# Altium integrated library GPDSE.IntLib: 634 symbols (part 6 of 7)
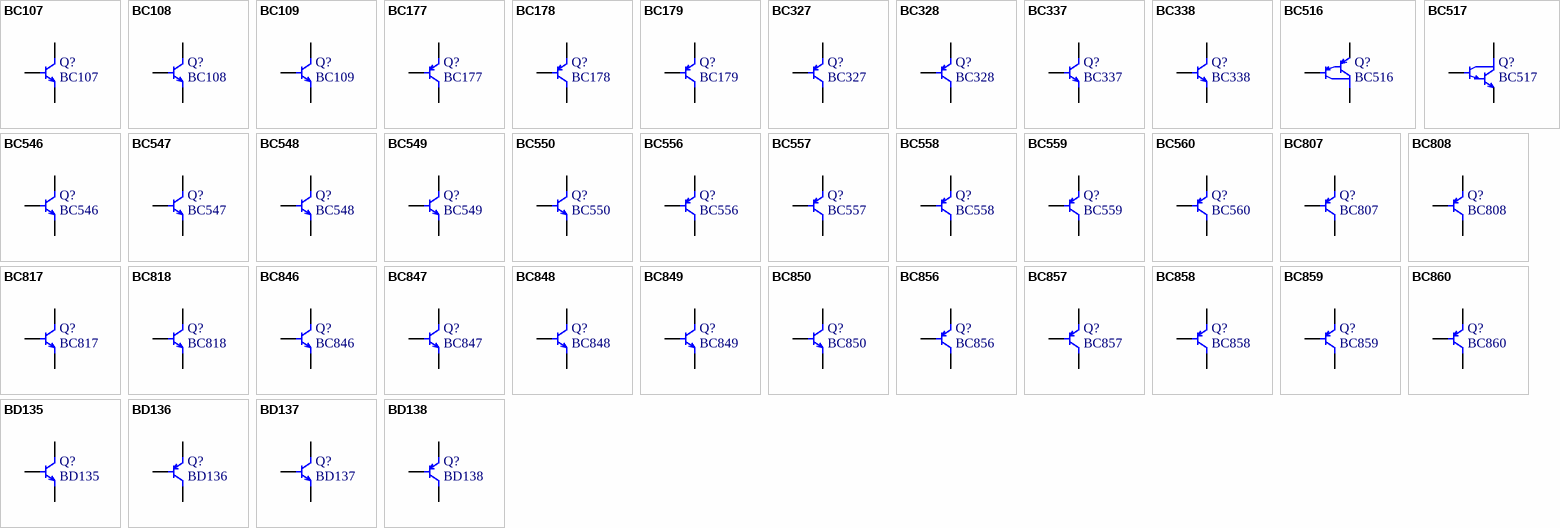
[diagram p40: symbols BC107 to BD138]

## BC338
designator Q?
NPN Epitaxial Silicon Transistor; Complementary Part: BC328; Collector-Emitter Voltage (Vce): 30 V; Emitter-Base Voltage (Veb): 5 V; Collector Current (Ic): 800 mA; Total Power Dissipation (Ptot): 625 mW; DC Current Gain Min (hfe): 60; DC Current Gain Max (hfe): 630; Transition Frequency (fT): 100 MHz
footprint TO-92/CBE (Transistor Outline Package, Case Style 92 CBE; 3D Sergey Atanov)
pins: B, C, E

## BC516
designator Q?
PNP Darlington Transistor; Complementary Part: BC517; Collector-Emitter Voltage (Vce): -30 V; Collector-Base Voltage (Vcb): -40 V; Emitter-Base Voltage (Veb): -10 V; DC Current Gain Min (hfe): 30.000; Power Dissipation (Pd): 625 mW; Transition Frequency (fT): 200 MHz; Collector Current (Ic): -1 A
footprint TO-92/CBE (Transistor Outline Package, Case Style 92 CBE; 3D Sergey Atanov)
pins: B, C, E

## BC517
designator Q?
NPN Darlington Transistor; Complementary Part: BC516; Collector-Emitter Voltage (Vce): 30 V; Collector-Base Voltage (Vcb): 40 V; Emitter-Base Voltage (Veb): 10 V; DC Current Gain Min (hfe): 30.000; Power Dissipation (Pd): 625 mW; Collector Current (Ic): 1.2 A
footprint TO-92/CBE (Transistor Outline Package, Case Style 92 CBE; 3D Sergey Atanov)
pins: B, C, E

## BC546
designator Q?
NPN Epitaxial Silicon Transistor; Complementary Part: BC556; Collector-Base Voltage (Vcb): 80 V; Collector-Emitter Voltage (Vce): 65 V; Emitter-Base Voltage (Veb): 6 V; Collector Current (Ic): 100 mA; Total Power Dissipation (Ptot): 500 mW; DC Current Gain Min (hfe): 110; DC Current Gain Max (hfe): 800; Transition Frequency (fT): 300 MHz
footprint TO-92/CBE (Transistor Outline Package, Case Style 92 CBE; 3D Sergey Atanov)
pins: B, C, E

## BC547
designator Q?
NPN Epitaxial Silicon Transistor; Complementary Part: BC557; Collector-Base Voltage (Vcb): 50 V; Collector-Emitter Voltage (Vce): 45 V; Emitter-Base Voltage (Veb): 6 V; Collector Current (Ic): 100 mA; Total Power Dissipation (Ptot): 500 mW; DC Current Gain Min (hfe): 110; DC Current Gain Max (hfe): 800; Transition Frequency (fT): 300 MHz
footprint TO-92/CBE (Transistor Outline Package, Case Style 92 CBE; 3D Sergey Atanov)
pins: B, C, E

## BC548
designator Q?
NPN Epitaxial Silicon Transistor; Complementary Part: BC558; Collector-Base Voltage (Vcb): 30 V; Emitter-Base Voltage (Veb): 5 V; Collector Current (Ic): 100 mA; Total Power Dissipation (Ptot): 500 mW; DC Current Gain Min (hfe): 110; DC Current Gain Max (hfe): 800; Transition Frequency (fT): 300 MHz; Collector-Emitter Voltage (Vce): 30 V
footprint TO-92/CBE (Transistor Outline Package, Case Style 92 CBE; 3D Sergey Atanov)
pins: B, C, E

## BC549
designator Q?
NPN Epitaxial Silicon Transistor; Complementary Part: BC559; Collector-Base Voltage (Vcb): 30 V; Emitter-Base Voltage (Veb): 5 V; Collector Current (Ic): 100 mA; Total Power Dissipation (Ptot): 500 mW; DC Current Gain Min (hfe): 110; DC Current Gain Max (hfe): 800; Transition Frequency (fT): 300 MHz; Collector-Emitter Voltage (Vce): 30 V
footprint TO-92/CBE (Transistor Outline Package, Case Style 92 CBE; 3D Sergey Atanov)
pins: B, C, E

## BC550
designator Q?
NPN Epitaxial Silicon Transistor; Complementary Part: BC560; Collector-Base Voltage (Vcb): 50 V; Collector-Emitter Voltage (Vce): 45 V; Emitter-Base Voltage (Veb): 5 V; Collector Current (Ic): 100 mA; Total Power Dissipation (Ptot): 500 mW; DC Current Gain Min (hfe): 110; DC Current Gain Max (hfe): 800; Transition Frequency (fT): 300 MHz
footprint TO-92/CBE (Transistor Outline Package, Case Style 92 CBE; 3D Sergey Atanov)
pins: B, C, E

## BC556
designator Q?
PNP Epitaxial Silicon Transistor; Complementary Part: BC546; Collector-Base Voltage (Vcb): -80 V; Collector-Emitter Voltage (Vce): -65 V; Emitter-Base Voltage (Veb): -5 V; Collector Current (Ic): -100 mA; Total Power Dissipation (Ptot): 500 mW; DC Current Gain Min (hfe): 110; DC Current Gain Max (hfe): 800; Transition Frequency (fT): 150 MHz
footprint TO-92/CBE (Transistor Outline Package, Case Style 92 CBE; 3D Sergey Atanov)
pins: B, C, E

## BC557
designator Q?
PNP Epitaxial Silicon Transistor; Complementary Part: BC547; Collector-Base Voltage (Vcb): -50 V; Collector-Emitter Voltage (Vce): -45 V; Emitter-Base Voltage (Veb): -5 V; Collector Current (Ic): -100 mA; Total Power Dissipation (Ptot): 500 mW; DC Current Gain Min (hfe): 110; DC Current Gain Max (hfe): 800; Transition Frequency (fT): 150 MHz
footprint TO-92/CBE (Transistor Outline Package, Case Style 92 CBE; 3D Sergey Atanov)
pins: B, C, E

## BC558
designator Q?
PNP Epitaxial Silicon Transistor; Complementary Part: BC548; Collector-Base Voltage (Vcb): -30 V; Emitter-Base Voltage (Veb): -5 V; Collector Current (Ic): -100 mA; Total Power Dissipation (Ptot): 500 mW; DC Current Gain Min (hfe): 110; DC Current Gain Max (hfe): 800; Transition Frequency (fT): 150 MHz; Collector-Emitter Voltage (Vce): -30 V
footprint TO-92/CBE (Transistor Outline Package, Case Style 92 CBE; 3D Sergey Atanov)
pins: B, C, E

## BC559
designator Q?
PNP Epitaxial Silicon Transistor; Complementary Part: BC549; Collector-Base Voltage (Vcb): -30 V; Emitter-Base Voltage (Veb): -5 V; Collector Current (Ic): -100 mA; Total Power Dissipation (Ptot): 500 mW; DC Current Gain Min (hfe): 110; DC Current Gain Max (hfe): 800; Transition Frequency (fT): 150 MHz; Collector-Emitter Voltage (Vce): -30 V
footprint TO-92/CBE (Transistor Outline Package, Case Style 92 CBE; 3D Sergey Atanov)
pins: B, C, E

## BC560
designator Q?
PNP Epitaxial Silicon Transistor; Complementary Part: BC550; Collector-Base Voltage (Vcb): -50 V; Collector-Emitter Voltage (Vce): -45 V; Emitter-Base Voltage (Veb): -5 V; Collector Current (Ic): -100 mA; Total Power Dissipation (Ptot): 500 mW; DC Current Gain Min (hfe): 110; DC Current Gain Max (hfe): 800; Transition Frequency (fT): 150 MHz
footprint TO-92/CBE (Transistor Outline Package, Case Style 92 CBE; 3D Sergey Atanov)
pins: B, C, E

## BC807
designator Q?
PNP Epitaxial Silicon Transistor; Complementary Part: BC817; Collector-Base Voltage (Vcb): -50 V; Collector-Emitter Voltage (Vce): -45 V; Emitter-Base Voltage (Veb): -5 V; Collector Current (Ic): -800 mA; Total Power Dissipation (Ptot): 310 mW; DC Current Gain Min (hfe): 60; DC Current Gain Max (hfe): 630; Transition Frequency (fT): 100 MHz
footprint SOT-23/3 (Small Outline Transistor 3 leads); pin to pad B>1 C>3 E>2
pins: B, C, E

## BC808
designator Q?
PNP Epitaxial Silicon Transistor; Complementary Part: BC818; Collector-Base Voltage (Vcb): -30 V; Collector-Emitter Voltage (Vce): -25 V; Emitter-Base Voltage (Veb): -5 V; Collector Current (Ic): -800 mA; Total Power Dissipation (Ptot): 310 mW; DC Current Gain Min (hfe): 60; DC Current Gain Max (hfe): 630; Transition Frequency (fT): 100 MHz
footprint SOT-23/3 (Small Outline Transistor 3 leads); pin to pad B>1 C>3 E>2
pins: B, C, E

## BC817
designator Q?
NPN Epitaxial Silicon Transistor; Complementary Part: BC807; Collector-Base Voltage (Vcb): 50 V; Collector-Emitter Voltage (Vce): 45 V; Emitter-Base Voltage (Veb): 5 V; Collector Current (Ic): 800 mA; Total Power Dissipation (Ptot): 310 mW; DC Current Gain Min (hfe): 60; DC Current Gain Max (hfe): 630; Transition Frequency (fT): 100 MHz
footprint SOT-23/3 (Small Outline Transistor 3 leads); pin to pad B>1 C>3 E>2
pins: B, C, E

## BC818
designator Q?
NPN Epitaxial Silicon Transistor; Complementary Part: BC808; Collector-Base Voltage (Vcb): 30 V; Collector-Emitter Voltage (Vce): 25 V; Emitter-Base Voltage (Veb): 5 V; Collector Current (Ic): 800 mA; Total Power Dissipation (Ptot): 310 mW; DC Current Gain Min (hfe): 60; DC Current Gain Max (hfe): 630; Transition Frequency (fT): 100 MHz
footprint SOT-23/3 (Small Outline Transistor 3 leads); pin to pad B>1 C>3 E>2
pins: B, C, E

## BC846
designator Q?
NPN Epitaxial Silicon Transistor; Complementary Part: BC856; Collector-Base Voltage (Vcb): 80 V; Collector-Emitter Voltage (Vce): 65 V; Emitter-Base Voltage (Veb): 6 V; Collector Current (Ic): 100 mA; Total Power Dissipation (Ptot): 310 mW; DC Current Gain Min (hfe): 110; DC Current Gain Max (hfe): 800; Transition Frequency (fT): 300 MHz
footprint SOT-23/3 (Small Outline Transistor 3 leads); pin to pad B>1 C>3 E>2
pins: B, C, E

## BC847
designator Q?
NPN Epitaxial Silicon Transistor; Complementary Part: BC857; Collector-Base Voltage (Vcb): 50 V; Collector-Emitter Voltage (Vce): 45 V; Emitter-Base Voltage (Veb): 6 V; Collector Current (Ic): 100 mA; Total Power Dissipation (Ptot): 310 mW; DC Current Gain Min (hfe): 110; DC Current Gain Max (hfe): 800; Transition Frequency (fT): 300 MHz
footprint SOT-23/3 (Small Outline Transistor 3 leads); pin to pad B>1 C>3 E>2
pins: B, C, E

## BC848
designator Q?
NPN Epitaxial Silicon Transistor; Complementary Part: BC858; Collector-Base Voltage (Vcb): 30 V; Emitter-Base Voltage (Veb): 5 V; Collector Current (Ic): 100 mA; Total Power Dissipation (Ptot): 310 mW; DC Current Gain Min (hfe): 110; DC Current Gain Max (hfe): 800; Transition Frequency (fT): 300 MHz; Collector-Emitter Voltage (Vce): 30 V
footprint SOT-23/3 (Small Outline Transistor 3 leads); pin to pad B>1 C>3 E>2
pins: B, C, E

## BC849
designator Q?
NPN Epitaxial Silicon Transistor; Complementary Part: BC859; Collector-Base Voltage (Vcb): 30 V; Emitter-Base Voltage (Veb): 5 V; Collector Current (Ic): 100 mA; Total Power Dissipation (Ptot): 310 mW; DC Current Gain Min (hfe): 110; DC Current Gain Max (hfe): 800; Transition Frequency (fT): 300 MHz; Collector-Emitter Voltage (Vce): 30 V
footprint SOT-23/3 (Small Outline Transistor 3 leads); pin to pad B>1 C>3 E>2
pins: B, C, E

## BC850
designator Q?
NPN Epitaxial Silicon Transistor; Complementary Part: BC860; Collector-Base Voltage (Vcb): 50 V; Collector-Emitter Voltage (Vce): 45 V; Emitter-Base Voltage (Veb): 5 V; Collector Current (Ic): 100 mA; Total Power Dissipation (Ptot): 310 mW; DC Current Gain Min (hfe): 110; DC Current Gain Max (hfe): 800; Transition Frequency (fT): 300 MHz
footprint SOT-23/3 (Small Outline Transistor 3 leads); pin to pad B>1 C>3 E>2
pins: B, C, E

## BC856
designator Q?
PNP Epitaxial Silicon Transistor; Complementary Part: BC846; Collector-Base Voltage (Vcb): -80 V; Collector-Emitter Voltage (Vce): -65 V; Emitter-Base Voltage (Veb): -5 V; Collector Current (Ic): -100 mA; Total Power Dissipation (Ptot): 310 mW; DC Current Gain Min (hfe): 110; DC Current Gain Max (hfe): 800; Transition Frequency (fT): 150 MHz
footprint SOT-23/3 (Small Outline Transistor 3 leads); pin to pad B>1 C>3 E>2
pins: B, C, E

## BC857
designator Q?
PNP Epitaxial Silicon Transistor; Complementary Part: BC847; Collector-Base Voltage (Vcb): -50 V; Collector-Emitter Voltage (Vce): -45 V; Emitter-Base Voltage (Veb): -5 V; Collector Current (Ic): -100 mA; Total Power Dissipation (Ptot): 310 mW; DC Current Gain Min (hfe): 110; DC Current Gain Max (hfe): 800; Transition Frequency (fT): 150 MHz
footprint SOT-23/3 (Small Outline Transistor 3 leads); pin to pad B>1 C>3 E>2
pins: B, C, E

## BC858
designator Q?
PNP Epitaxial Silicon Transistor; Complementary Part: BC848; Collector-Base Voltage (Vcb): -30 V; Emitter-Base Voltage (Veb): -5 V; Collector Current (Ic): -100 mA; Total Power Dissipation (Ptot): 310 mW; DC Current Gain Min (hfe): 110; DC Current Gain Max (hfe): 800; Transition Frequency (fT): 150 MHz; Collector-Emitter Voltage (Vce): -30 V
footprint SOT-23/3 (Small Outline Transistor 3 leads); pin to pad B>1 C>3 E>2
pins: B, C, E

## BC859
designator Q?
PNP Epitaxial Silicon Transistor; Complementary Part: BC849; Collector-Base Voltage (Vcb): -30 V; Emitter-Base Voltage (Veb): -5 V; Collector Current (Ic): -100 mA; Total Power Dissipation (Ptot): 310 mW; DC Current Gain Min (hfe): 110; DC Current Gain Max (hfe): 800; Transition Frequency (fT): 150 MHz; Collector-Emitter Voltage (Vce): -30 V
footprint SOT-23/3 (Small Outline Transistor 3 leads); pin to pad B>1 C>3 E>2
pins: B, C, E

## BC860
designator Q?
PNP Epitaxial Silicon Transistor; Complementary Part: BC850; Collector-Base Voltage (Vcb): -50 V; Collector-Emitter Voltage (Vce): -45 V; Emitter-Base Voltage (Veb): -5 V; Collector Current (Ic): -100 mA; Total Power Dissipation (Ptot): 310 mW; DC Current Gain Min (hfe): 110; DC Current Gain Max (hfe): 800; Transition Frequency (fT): 150 MHz
footprint SOT-23/3 (Small Outline Transistor 3 leads); pin to pad B>1 C>3 E>2
pins: B, C, E

## BD135
designator Q?
NPN Epitaxial Silicon Transistor; Complementary Part: BD136; Collector-Base Voltage (Vcb): 45 V; Emitter-Base Voltage (Veb): 5 V; Collector Current (Ic): 1.5 A; Collector Peak Current (Icp): 3 A; Base Peak Current (Ibp): 0.5 A; Total Power Dissipation (Ptot): 12.5 W; DC Current Gain Min (hfe): 25; DC Current Gain Max (hfe): 250; Collector-Emitter Voltage (Vce): 45 V
footprint TO-126/ECB
pins: B, C, E

## BD136
designator Q?
PNP Epitaxial Silicon Transistor; Collector-Base Voltage (Vcb): -45 V; Emitter-Base Voltage (Veb): -5 V; Collector Current (Ic): -1.5 A; Collector Peak Current (Icp): -3 A; Base Peak Current (Ibp): -0.5 A; Total Power Dissipation (Ptot): 12.5 W; DC Current Gain Min (hfe): 25; DC Current Gain Max (hfe): 250; Collector-Emitter Voltage (Vce): -45 V; Complementary Part: BD136
footprint TO-126/ECB
pins: B, C, E

## BD137
designator Q?
NPN Epitaxial Silicon Transistor; Complementary Part: BD138; Collector-Base Voltage (Vcb): 60 V; Emitter-Base Voltage (Veb): 5 V; Collector Current (Ic): 1.5 A; Collector Peak Current (Icp): 3 A; Base Peak Current (Ibp): 0.5 A; Total Power Dissipation (Ptot): 12.5 W; DC Current Gain Min (hfe): 25; DC Current Gain Max (hfe): 250; Collector-Emitter Voltage (Vce): 60 V
footprint TO-126/ECB
pins: B, C, E

## BD138
designator Q?
PNP Epitaxial Silicon Transistor; Collector-Base Voltage (Vcb): -60 V; Emitter-Base Voltage (Veb): -5 V; Collector Current (Ic): -1.5 A; Collector Peak Current (Icp): -3 A; Base Peak Current (Ibp): -0.5 A; Total Power Dissipation (Ptot): 12.5 W; DC Current Gain Min (hfe): 25; DC Current Gain Max (hfe): 250; Collector-Emitter Voltage (Vce): -60 V; Complementary Part: BD138
footprint TO-126/ECB
pins: B, C, E

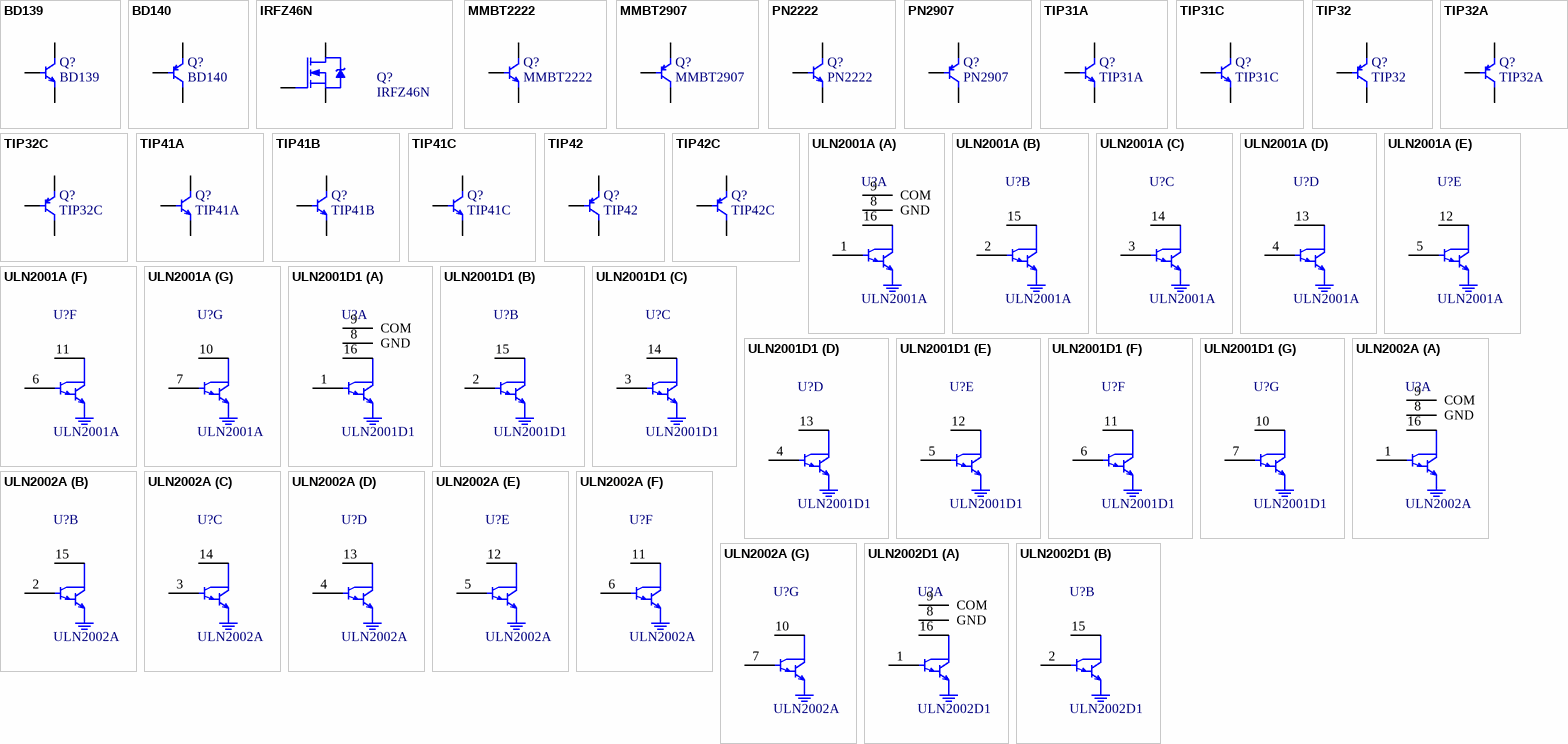
[diagram p25: symbols BD139 to ULN2002D1]

## BD139
designator Q?
NPN Epitaxial Silicon Transistor; Complementary Part: BD140; Collector-Base Voltage (Vcb): 80 V; Emitter-Base Voltage (Veb): 5 V; Collector Current (Ic): 1.5 A; Collector Peak Current (Icp): 3 A; Base Peak Current (Ibp): 0.5 A; Total Power Dissipation (Ptot): 12.5 W; DC Current Gain Min (hfe): 25; DC Current Gain Max (hfe): 250; Collector-Emitter Voltage (Vce): 80 V
footprint TO-126/ECB
pins: B, C, E

## BD140
designator Q?
PNP Epitaxial Silicon Transistor; Collector-Base Voltage (Vcb): -80 V; Emitter-Base Voltage (Veb): -5 V; Collector Current (Ic): -1.5 A; Collector Peak Current (Icp): -3 A; Base Peak Current (Ibp): -0.5 A; Total Power Dissipation (Ptot): 12.5 W; DC Current Gain Min (hfe): 25; DC Current Gain Max (hfe): 250; Collector-Emitter Voltage (Vce): -80 V; Complementary Part: BD140
footprint TO-126/ECB
pins: B, C, E

## IRFZ46N
designator Q?
HEXFET Power MOSFET; Drain Current (Id): 53 A; Drain Current Peak (Idp): 180 A; Power Dissipation (Pd): 107 W; Gate-to-Source Voltage (Vgs): 20 V; Static Drain-to-Source On-Resistance (Rdson): 16.5 mR; Turn-On Delay (tdon): 14 ns; Rise Time (Rt): 76 ns; Fall Time (Tf): 57 ns; Turn-Off Delay (Tdoff): 52 ns
footprint TO-220/123 (TO, Thru-Hole, Vertical, Heatsink Mounted; 3 In-Line Leads; Pitch 2.54 mm); pin to pad D>2 G>1 S>3
pins: D, G, S

## MMBT2222
designator Q?
NPN Epitaxial Silicon Transistor; Complementary Part: MMBT2907; Collector-Base Voltage (Vcb): 60 V; Collector-Emitter Voltage (Vce): 30 V; Emitter-Base Voltage (Veb): 5 V; Collector Current (Ic): 600 mA; Total Power Dissipation (Ptot): 350 mW; DC Current Gain Min (hfe): 35; DC Current Gain Max (hfe): 300; Transition Frequency (fT): 300 MHz
footprint SOT-23/3 (Small Outline Transistor 3 leads); pin to pad B>1 C>3 E>2
pins: B, C, E

## MMBT2907
designator Q?
PNP Epitaxial Silicon Transistor; Complementary Part: MMBT2222; Collector-Base Voltage (Vcb): -60 V; Collector-Emitter Voltage (Vce): -40 V; Emitter-Base Voltage (Veb): -5 V; Collector Current (Ic): -800 mA; Total Power Dissipation (Ptot): 350 mW; DC Current Gain Min (hfe): 30; DC Current Gain Max (hfe): 300; Transition Frequency (fT): 300 MHz
footprint SOT-23/3 (Small Outline Transistor 3 leads); pin to pad B>1 C>3 E>2
pins: B, C, E

## PN2222
designator Q?
NPN Epitaxial Silicon Transistor; Complementary Part: PN2907; Collector-Base Voltage (Vcb): 60 V; Collector-Emitter Voltage (Vce): 30 V; Emitter-Base Voltage (Veb): 5 V; Collector Current (Ic): 600 mA; Total Power Dissipation (Ptot): 625 mW; DC Current Gain Min (hfe): 35; DC Current Gain Max (hfe): 300; Transition Frequency (fT): 300 MHz
footprint TO-92/EBC (Transistor Outline Package, Case Style 92 EBC; 3D Sergey Atanov)
pins: B, C, E

## PN2907
designator Q?
PNP Epitaxial Silicon Transistor; Complementary Part: PN2222; Collector-Base Voltage (Vcb): -60 V; Collector-Emitter Voltage (Vce): -40 V; Emitter-Base Voltage (Veb): -5 V; Collector Current (Ic): -800 mA; Total Power Dissipation (Ptot): 625 mW; DC Current Gain Min (hfe): 30; DC Current Gain Max (hfe): 300; Transition Frequency (fT): 300 MHz
footprint TO-92/EBC (Transistor Outline Package, Case Style 92 EBC; 3D Sergey Atanov)
pins: B, C, E

## TIP31A
designator Q?
NPN Epitaxial Silicon Transistor; Complementary Part: TIP32A; Collector-Base Voltage (Vcb): 60 V; Emitter-Base Voltage (Veb): 5 V; Collector Current (Ic): 3 A; Collector Peak Current (Icp): 5 A; Base Peak Current (Ibp): 1 A; Total Power Dissipation (Ptot): 40 W; DC Current Gain Min (hfe): 10; DC Current Gain Max (hfe): 50; Transition Frequency (fT): 3 MHz; Collector-Emitter Voltage (Vce): 60 V
footprint TO-220/BCE (TO, Thru-Hole, Vertical, Heatsink Mounted; 3 In-Line Leads; Pitch 2.54 mm)
pins: B, C, E

## TIP31C
designator Q?
NPN Epitaxial Silicon Transistor; Complementary Part: TIP32C; Collector-Base Voltage (Vcb): 100 V; Emitter-Base Voltage (Veb): 5 V; Collector Current (Ic): 3 A; Collector Peak Current (Icp): 5 A; Base Peak Current (Ibp): 1 A; Total Power Dissipation (Ptot): 40 W; DC Current Gain Min (hfe): 10; DC Current Gain Max (hfe): 50; Transition Frequency (fT): 3 MHz; Collector-Emitter Voltage (Vce): 100 V
footprint TO-220/BCE (TO, Thru-Hole, Vertical, Heatsink Mounted; 3 In-Line Leads; Pitch 2.54 mm)
pins: B, C, E

## TIP32
designator Q?
PNP Epitaxial Silicon Transistor; Complementary Part: TIP31; Collector-Base Voltage (Vcb): -40 V; Emitter-Base Voltage (Veb): -5 V; Collector Current (Ic): -3 A; Collector Peak Current (Icp): -5 A; Total Power Dissipation (Ptot): 40 W; DC Current Gain Min (hfe): 10; DC Current Gain Max (hfe): 50; Transition Frequency (fT): 3 MHz; Collector-Emitter Voltage (Vce): -40 V; Base Peak Current (Ibp): -3 A
footprint TO-220/BCE (TO, Thru-Hole, Vertical, Heatsink Mounted; 3 In-Line Leads; Pitch 2.54 mm)
pins: B, C, E

## TIP32A
designator Q?
PNP Epitaxial Silicon Transistor; Complementary Part: TIP31A; Collector-Base Voltage (Vcb): -60 V; Emitter-Base Voltage (Veb): -5 V; Collector Current (Ic): -3 A; Collector Peak Current (Icp): -5 A; Total Power Dissipation (Ptot): 40 W; DC Current Gain Min (hfe): 10; DC Current Gain Max (hfe): 50; Transition Frequency (fT): 3 MHz; Collector-Emitter Voltage (Vce): -60 V; Base Peak Current (Ibp): -3 A
footprint TO-220/BCE (TO, Thru-Hole, Vertical, Heatsink Mounted; 3 In-Line Leads; Pitch 2.54 mm)
pins: B, C, E

## TIP32C
designator Q?
PNP Epitaxial Silicon Transistor; Complementary Part: TIP31C; Collector-Base Voltage (Vcb): -100 V; Emitter-Base Voltage (Veb): -5 V; Collector Current (Ic): -3 A; Collector Peak Current (Icp): -5 A; Total Power Dissipation (Ptot): 40 W; DC Current Gain Min (hfe): 10; DC Current Gain Max (hfe): 50; Transition Frequency (fT): 3 MHz; Collector-Emitter Voltage (Vce): -100 V; Base Peak Current (Ibp): -3 A
footprint TO-220/BCE (TO, Thru-Hole, Vertical, Heatsink Mounted; 3 In-Line Leads; Pitch 2.54 mm)
pins: B, C, E

## TIP41A
designator Q?
NPN Epitaxial Silicon Transistor; Complementary Part: TIP42A; Collector-Base Voltage (Vcb): 60 V; Emitter-Base Voltage (Veb): 5 V; Collector Current (Ic): 6 A; Collector Peak Current (Icp): 10 A; Base Peak Current (Ibp): 2 A; Total Power Dissipation (Ptot): 65 W; DC Current Gain Min (hfe): 15; DC Current Gain Max (hfe): 75; Transition Frequency (fT): 3 MHz; Collector-Emitter Voltage (Vce): 60 V
footprint TO-220/BCE (TO, Thru-Hole, Vertical, Heatsink Mounted; 3 In-Line Leads; Pitch 2.54 mm)
pins: B, C, E

## TIP41B
designator Q?
NPN Epitaxial Silicon Transistor; Complementary Part: TIP42B; Collector-Base Voltage (Vcb): 80 V; Emitter-Base Voltage (Veb): 5 V; Collector Current (Ic): 6 A; Collector Peak Current (Icp): 10 A; Base Peak Current (Ibp): 2 A; Total Power Dissipation (Ptot): 65 W; DC Current Gain Min (hfe): 15; DC Current Gain Max (hfe): 75; Transition Frequency (fT): 3 MHz; Collector-Emitter Voltage (Vce): 80 V
footprint TO-220/BCE (TO, Thru-Hole, Vertical, Heatsink Mounted; 3 In-Line Leads; Pitch 2.54 mm)
pins: B, C, E

## TIP41C
designator Q?
NPN Epitaxial Silicon Transistor; Complementary Part: TIP42C; Collector-Base Voltage (Vcb): 100 V; Emitter-Base Voltage (Veb): 5 V; Collector Current (Ic): 6 A; Collector Peak Current (Icp): 10 A; Base Peak Current (Ibp): 2 A; Total Power Dissipation (Ptot): 65 W; DC Current Gain Min (hfe): 15; DC Current Gain Max (hfe): 75; Transition Frequency (fT): 3 MHz; Collector-Emitter Voltage (Vce): 100 V
footprint TO-220/BCE (TO, Thru-Hole, Vertical, Heatsink Mounted; 3 In-Line Leads; Pitch 2.54 mm)
pins: B, C, E

## TIP42
designator Q?
PNP Epitaxial Silicon Transistor; Complementary Part: TIP41; Collector-Base Voltage (Vcb): -40 V; Emitter-Base Voltage (Veb): -5 V; Collector Current (Ic): -6 A; Collector Peak Current (Icp): -10 A; Base Peak Current (Ibp): -2 A; Total Power Dissipation (Ptot): 65 W; DC Current Gain Min (hfe): 15; DC Current Gain Max (hfe): 75; Transition Frequency (fT): 3 MHz; Collector-Emitter Voltage (Vce): -40 V
footprint TO-220/BCE (TO, Thru-Hole, Vertical, Heatsink Mounted; 3 In-Line Leads; Pitch 2.54 mm)
pins: B, C, E

## TIP42C
designator Q?
PNP Epitaxial Silicon Transistor; Complementary Part: TIP41C; Collector-Base Voltage (Vcb): -100 V; Emitter-Base Voltage (Veb): -5 V; Collector Current (Ic): -6 A; Collector Peak Current (Icp): -10 A; Base Peak Current (Ibp): -2 A; Total Power Dissipation (Ptot): 65 W; DC Current Gain Min (hfe): 15; DC Current Gain Max (hfe): 75; Transition Frequency (fT): 3 MHz; Collector-Emitter Voltage (Vce): -100 V
footprint TO-220/BCE (TO, Thru-Hole, Vertical, Heatsink Mounted; 3 In-Line Leads; Pitch 2.54 mm)
pins: B, C, E

## ULN2001A
designator U?
Seven Darlington Array
footprint DIP16-300(100) (DIP, 16-Leads, Row Spacing 7.62mm, Pitch 2.54mm, Body 22.86x6.35mm)
part A pins: 1 1B, 8 GND, 9 COM, 16 1C
part B pins: 2 2B, 15 2C
part C pins: 3 3B, 14 3C
part D pins: 4 4B, 13 4C
part E pins: 5 5B, 12 5C
part F pins: 6 6B, 11 6C
part G pins: 7 7B, 10 7C

## ULN2001D1
designator U?
Seven Darlington Array
footprint SOIC16-150(50) (SOIC 16 Leads; Row Spacing 3.81 mm; Pitch 1.27 mm; 3D André L´Hérault)
part A pins: 1 1B, 8 GND, 9 COM, 16 1C
part B pins: 2 2B, 15 2C
part C pins: 3 3B, 14 3C
part D pins: 4 4B, 13 4C
part E pins: 5 5B, 12 5C
part F pins: 6 6B, 11 6C
part G pins: 7 7B, 10 7C

## ULN2002A
designator U?
Seven Darlington Array
footprint DIP16-300(100) (DIP, 16-Leads, Row Spacing 7.62mm, Pitch 2.54mm, Body 22.86x6.35mm)
part A pins: 1 1B, 8 GND, 9 COM, 16 1C
part B pins: 2 2B, 15 2C
part C pins: 3 3B, 14 3C
part D pins: 4 4B, 13 4C
part E pins: 5 5B, 12 5C
part F pins: 6 6B, 11 6C
part G pins: 7 7B, 10 7C

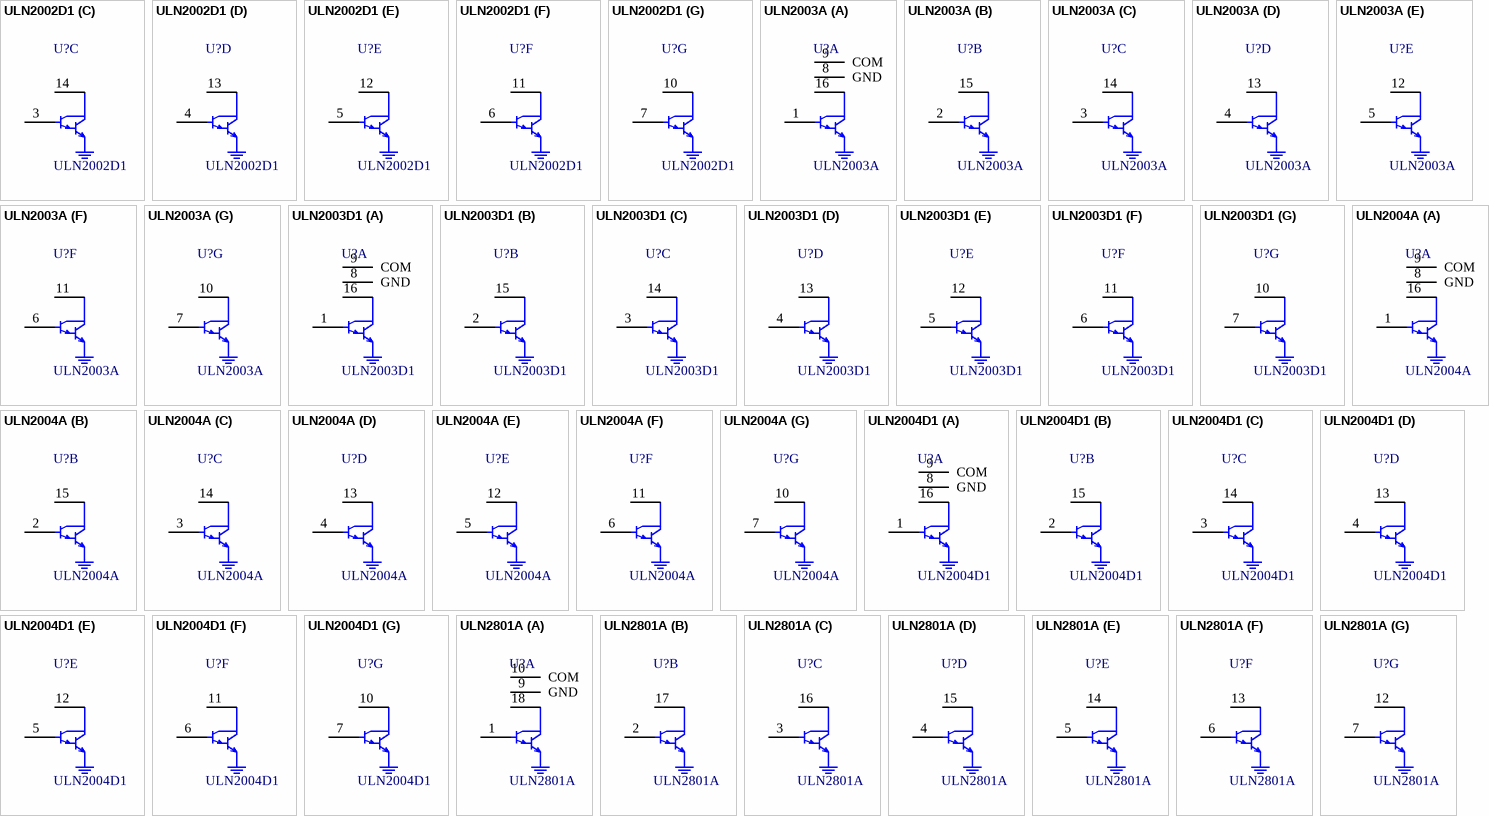
[diagram p26: symbols ULN2002D1 to ULN2801A]

## ULN2002D1
designator U?
Seven Darlington Array
footprint SOIC16-150(50) (SOIC 16 Leads; Row Spacing 3.81 mm; Pitch 1.27 mm; 3D André L´Hérault)
part A pins: 1 1B, 8 GND, 9 COM, 16 1C
part B pins: 2 2B, 15 2C
part C pins: 3 3B, 14 3C
part D pins: 4 4B, 13 4C
part E pins: 5 5B, 12 5C
part F pins: 6 6B, 11 6C
part G pins: 7 7B, 10 7C

## ULN2003A
designator U?
Seven Darlington Array
footprint DIP16-300(100) (DIP, 16-Leads, Row Spacing 7.62mm, Pitch 2.54mm, Body 22.86x6.35mm)
part A pins: 1 1B, 8 GND, 9 COM, 16 1C
part B pins: 2 2B, 15 2C
part C pins: 3 3B, 14 3C
part D pins: 4 4B, 13 4C
part E pins: 5 5B, 12 5C
part F pins: 6 6B, 11 6C
part G pins: 7 7B, 10 7C

## ULN2003D1
designator U?
Seven Darlington Array
footprint SOIC16-150(50) (SOIC 16 Leads; Row Spacing 3.81 mm; Pitch 1.27 mm; 3D André L´Hérault)
part A pins: 1 1B, 8 GND, 9 COM, 16 1C
part B pins: 2 2B, 15 2C
part C pins: 3 3B, 14 3C
part D pins: 4 4B, 13 4C
part E pins: 5 5B, 12 5C
part F pins: 6 6B, 11 6C
part G pins: 7 7B, 10 7C

## ULN2004A
designator U?
Seven Darlington Array
footprint DIP16-300(100) (DIP, 16-Leads, Row Spacing 7.62mm, Pitch 2.54mm, Body 22.86x6.35mm)
part A pins: 1 1B, 8 GND, 9 COM, 16 1C
part B pins: 2 2B, 15 2C
part C pins: 3 3B, 14 3C
part D pins: 4 4B, 13 4C
part E pins: 5 5B, 12 5C
part F pins: 6 6B, 11 6C
part G pins: 7 7B, 10 7C

## ULN2004D1
designator U?
Seven Darlington Array
footprint SOIC16-150(50) (SOIC 16 Leads; Row Spacing 3.81 mm; Pitch 1.27 mm; 3D André L´Hérault)
part A pins: 1 1B, 8 GND, 9 COM, 16 1C
part B pins: 2 2B, 15 2C
part C pins: 3 3B, 14 3C
part D pins: 4 4B, 13 4C
part E pins: 5 5B, 12 5C
part F pins: 6 6B, 11 6C
part G pins: 7 7B, 10 7C

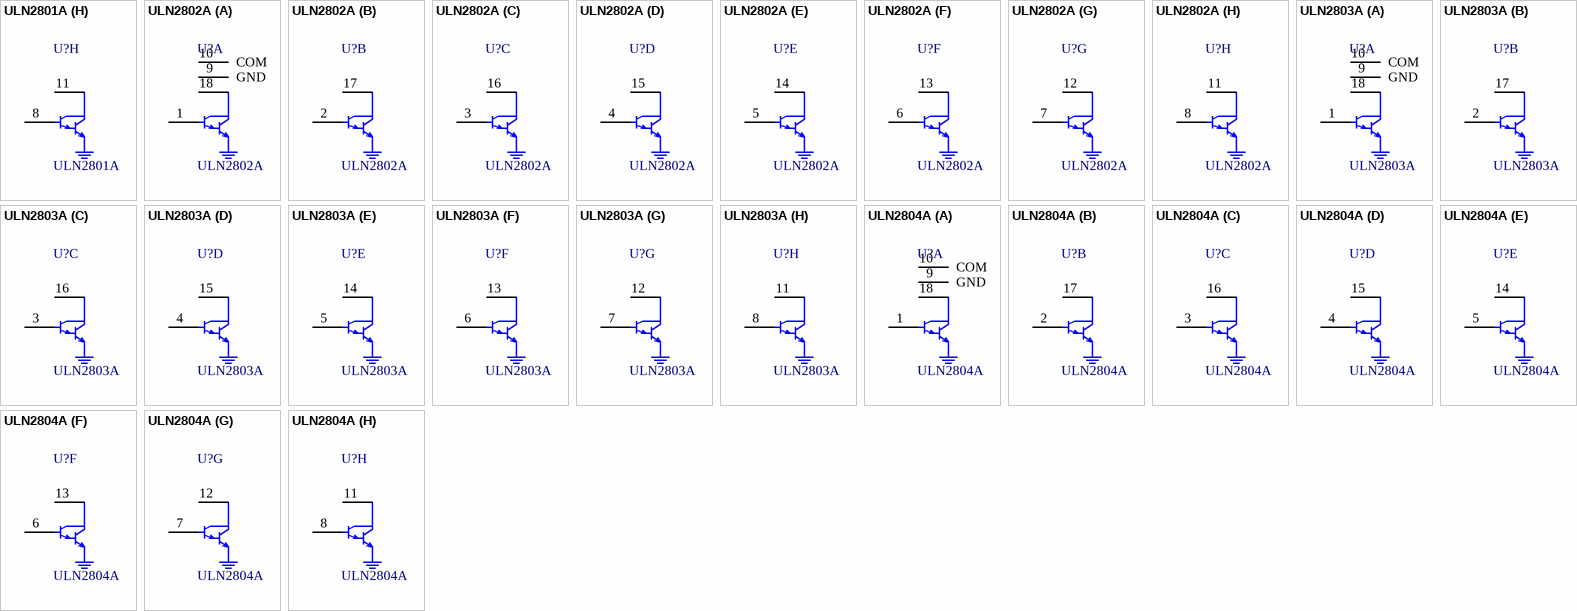
[diagram p27: symbols ULN2801A to ULN2804A]

## ULN2801A
designator U?
Eight Darlington Array
footprint DIP18-300(100) (DIP, 18-Leads, Row Spacing 7.62mm, Pitch 2.54mm, Body ?)
part A pins: 1 1B, 9 GND, 10 COM, 18 1C
part B pins: 2 2B, 17 2C
part C pins: 3 3B, 16 3C
part D pins: 4 4B, 15 4C
part E pins: 5 5B, 14 5C
part F pins: 6 6B, 13 6C
part G pins: 7 7B, 12 7C
part H pins: 8 8B, 11 8C

## ULN2802A
designator U?
Eight Darlington Array
footprint DIP18-300(100) (DIP, 18-Leads, Row Spacing 7.62mm, Pitch 2.54mm, Body ?)
part A pins: 1 1B, 9 GND, 10 COM, 18 1C
part B pins: 2 2B, 17 2C
part C pins: 3 3B, 16 3C
part D pins: 4 4B, 15 4C
part E pins: 5 5B, 14 5C
part F pins: 6 6B, 13 6C
part G pins: 7 7B, 12 7C
part H pins: 8 8B, 11 8C

## ULN2803A
designator U?
Eight Darlington Array
footprint DIP18-300(100) (DIP, 18-Leads, Row Spacing 7.62mm, Pitch 2.54mm, Body ?)
part A pins: 1 1B, 9 GND, 10 COM, 18 1C
part B pins: 2 2B, 17 2C
part C pins: 3 3B, 16 3C
part D pins: 4 4B, 15 4C
part E pins: 5 5B, 14 5C
part F pins: 6 6B, 13 6C
part G pins: 7 7B, 12 7C
part H pins: 8 8B, 11 8C

## ULN2804A
designator U?
Eight Darlington Array
footprint DIP18-300(100) (DIP, 18-Leads, Row Spacing 7.62mm, Pitch 2.54mm, Body ?)
part A pins: 1 1B, 9 GND, 10 COM, 18 1C
part B pins: 2 2B, 17 2C
part C pins: 3 3B, 16 3C
part D pins: 4 4B, 15 4C
part E pins: 5 5B, 14 5C
part F pins: 6 6B, 13 6C
part G pins: 7 7B, 12 7C
part H pins: 8 8B, 11 8C

